# Altium footprint library XL4015.PcbLib: 1 footprints
Each footprint in its own frame and in the unit in brackets; x right, y up, seen from the top. Pads: shape width x height; smd on the part's side, far side on the other; paste and mask are expansions set on the pad; w line width, h text height; cw(c..) or ccw(c..) is an arc to the next point about the centre after c.
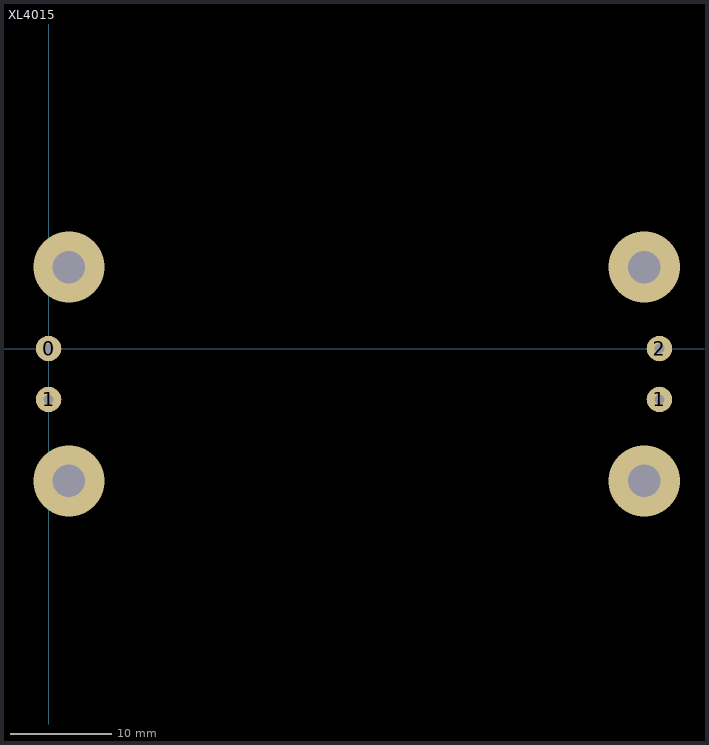
[diagram p0: the footprint, top view; thin cyan lines are the x and y axes]

## XL4015 [mm]
pads (4):
  round 2.5 hole 1: 0(0,0) 1(0,-5) 1(60,-5) 2(60,0)
via 2,8 diameter 7 hole 3.2
via 58.5,8 diameter 7 hole 3.2
via 58.5,-13 diameter 7 hole 3.2
via 2,-13 diameter 7 hole 3.2
3D body "XL4015.STEP": height 21.57, standoff 3.7, extent -0.751,-15.659 60.949,10.541